# Altium integrated library CustomDevices_OKP.IntLib: 123 symbols (continued)
## Intel_Max10
designator U?, comment 10M16DCF484I6G
footprint 484-Pin FBGA
part A pins: A1 GND, A22 GND, AA4 GND, AA18 GND, AB1 GND, AB22 GND, B6 GND, B9 GND, B13 GND, B18 GND, D4 GND, D11 GND, D16 GND, D20 GND, E2 GND, E7 GND, F10 GND, F13 GND, G5 GND, G6 GND, G8 GND, G15 GND, G18 GND, G21 GND, H5 GND, J2 GND, J6 GND, J16 GND, J19 GND, K10 GND, K12 GND, L5 GND, L13 GND, L17 GND, L21 GND, M7 GND, M10 GND, M16 GND, M19 GND, N11 GND, N13 GND, P2 GND, P6 GND, P17 GND, R19 GND, R21 GND, T4 GND, T8 GND, T14 GND, T16 GND, U10 GND, U13 GND, V2 GND, V6 GND, V19 GND, W21 GND, Y9 GND, Y12 GND, Y15 GND
part B pins: A16 nc, A21 nc, AA17 nc, AA19 nc, AB19 nc, AB20 nc, B16 nc, B20 nc, B21 nc, B22 nc, C15 nc, C16 nc, E5 nc, E17 nc, F6 nc, F17 nc, H18 nc, H19 nc, H20 nc, J5 nc, J14 nc, J15 nc, J18 nc, J20 nc, K3 nc, K18 nc, K19 nc, K20 nc, L3 nc, P8 nc, R7 nc, U3 nc, U4 nc, U5 nc, U19 nc, V3 nc, V15 nc, V18 nc, W1 nc, W2 nc, W16 nc, W22 nc, Y17 nc, Y18 nc, Y22 nc
part C pins: AA4 VREF, AA13 VREF, B15 VREF, C1 VREF, D7 VREF, D21 VREF, F9 VCCIO, F11 VCCIO, F12 VCCIO, F14 VCCIO, G7 VCCP/BCCR/VCCT, G10 VCCIO, G11 VCCIO, G12 VCCIO, G13 VCCIO, G14 VCCIO, G16 VCCP/BCCR/VCCT, H15 VCCA, H16 VCCIO, J7 VCCP/BCCR/VCCT, J17 VCCIO, K7 VCCIO, K11 VCCP/BCCR/VCCT, K13 VCCP/BCCR/VCCT, K16 VCCIO, K17 VCCIO, L6 VCCIO, L7 VCCIO, L10 VCCP/BCCR/VCCT, L11 VCCP/BCCR/VCCT, L12 VCCP/BCCR/VCCT, L16 VCCIO, M2 VREF, M6 VCCIO, M11 VCCP/BCCR/VCCT, M12 VCCP/BCCR/VCCT, M13 VCCP/BCCR/VCCT, M17 VCCIO, N6 VCCIO, N7 VCCIO, N10 VCCP/BCCR/VCCT, N12 VCCP/BCCR/VCCT, N16 VCCIO, N17 VCCIO, P7 VCCIO, P16 VCCIO, P22 VREF, R6 VCCIO, R8 VCCA, R16 VCCIO, R17 VCCIO, T7 VCCP/BCCR/VCCT, T9 VCCIO, T10 VCCIO, T11 VCCIO, T12 VCCIO, T13 VCCIO, T15 VCCA, T17 VCCIO, U8 VCCIO, U9 VCCIO, U11 VCCIO, U12 VCCIO, U14 VCCIO
part D pins: AA1 DATA_IN28, AA2 DATA_IN29, AA5 DATA_IN41, AA6 DATA_IN40, AA7 DATA_IN39, AA8 DATA_IN38, AA9 DATA_IN37, AA10 DATA_IN36, AB2 DATA_IN30, AB3 DATA_IN31, AB4 DATA_IN47, AB5 DATA_IN46, AB6 DATA_IN45, AB7 DATA_IN44, AB8 DATA_IN43, AB9 DATA_IN42, N2 DATA_IN0, P1 DATA_IN4, P3 DATA_IN3, P4 DATA_IN2, P5 DATA_IN1, R1 DATA_IN9, R2 DATA_IN8, R3 DATA_IN7, R4 DATA_IN6, R5 DATA_IN5, T1 DATA_IN12, T2 DATA_IN11, T3 DATA_IN10, U1 DATA_IN14, U2 DATA_IN13, V1 DATA_IN15, V4 DATA_IN16, W3 DATA_IN23, W4 DATA_IN22, W5 DATA_IN21, W6 DATA_IN20, W7 DATA_IN19, W8 DATA_IN18, W9 DATA_IN17, W10 DATA_IN33, Y1 DATA_IN27, Y2 DATA_IN26, Y3 DATA_IN25, Y4 DATA_IN24, Y7 DATA_IN35, Y8 DATA_IN34, Y10 DATA_IN32
part E pins: AA11 DATA_IN60, AA12 DATA_IN59, AA14 DATA_IN57, AA15 DATA_IN55, AA16 DATA_IN75, AA20 DATA_IN69, AA21 DATA_IN67, AA22 DATA_IN65, AB10 DATA_IN63, AB11 DATA_IN62, AB12 DATA_IN61, AB13 DATA_IN58, AB14 DATA_IN56, AB16 DATA_IN78, AB17 DATA_IN77, AB18 DATA_IN76, AB21 DATA_IN68, K6 DATA_IN92, T20 DATA_IN79, T21 DATA_IN80, U18 DATA_IN84, U20 DATA_IN83, U21 DATA_IN82, U22 DATA_IN81, V11 DATA_IN90, V12 DATA_IN89, V13 DATA_IN88, V14 DATA_IN87, V16 DATA_IN86, V17 DATA_IN85, V20 DATA_IN93, V22 DATA_IN91, W11 DATA_IN51, W12 DATA_IN50, W13 DATA_IN49, W14 DATA_IN48, W15 DATA_IN73, W17 DATA_IN72, W18 DATA_IN71, W19 DATA_IN95, W20 DATA_IN94, Y11 DATA_IN54, Y13 DATA_IN53, Y14 DATA_IN52, Y16 DATA_IN74, Y19 DATA_IN70, Y20 DATA_IN66, Y21 DATA_IN64
part F pins: A2 DATA_IN138, A3 DATA_IN137, A4 DATA_IN136, A5 DATA_IN135, A6 DATA_IN134, A7 DATA_IN133, A8 DATA_IN130, A9 DATA_IN128, B1 DATA_IN143, B2 DATA_IN142, B3 DATA_IN141, B4 DATA_IN140, B5 DATA_IN139, B7 DATA_IN132, B8 DATA_IN129, C3 DATA_IN115, C4 DATA_IN114, C5 DATA_IN113, C7 DATA_IN131, D1 DATA_IN127, D2 DATA_IN126, D5 DATA_IN116, D6 DATA_IN112, E1 DATA_IN97, E3 DATA_IN96, E4 DATA_IN118, E6 DATA_IN117, F1 DATA_IN98, F3 DATA_IN121, F4 DATA_IN120, F5 DATA_IN119, G1 DATA_IN101, G3 DATA_IN123, G4 DATA_IN122, H1 DATA_IN102, H3 DATA_IN125, H4 DATA_IN124, J1 DATA_IN106, J3 DATA_IN105, J4 DATA_IN103, J8 DATA_IN99, K1 DATA_IN108, K2 DATA_IN107, K4 DATA_IN104, K5 DATA_IN100, L1 DATA_IN110, L2 DATA_IN109, M1 DATA_IN111
part G pins: A10 DATA_IN154, A11 DATA_IN155, A12 DATA_IN156, A13 DATA_IN157, A14 DATA_IN158, A15 DATA_IN159, A17 DATA_IN172, A18 DATA_IN173, A19 DATA_IN174, A20 DATA_IN175, B10 DATA_IN150, B11 DATA_IN151, B12 DATA_IN152, B14 DATA_IN153, B17 DATA_IN170, B19 DATA_IN171, C9 DATA_IN144, C10 DATA_IN145, C11 DATA_IN146, C12 DATA_IN147, C13 DATA_IN148, C14 DATA_IN149, C17 DATA_IN168, C18 DATA_IN169, D12 DATA_IN164, D13 DATA_IN165, D14 DATA_IN166, D15 DATA_IN167, E12 DATA_IN160, E13 DATA_IN161, E14 DATA_IN162, E15 DATA_IN163, E21 DATA_IN178, E22 DATA_IN184, F21 DATA_IN179, F22 DATA_IN185, G19 DATA_IN177, G20 DATA_IN176, G22 DATA_IN186, H21 DATA_IN180, H22 DATA_IN187, J21 DATA_IN181, J22 DATA_IN188, L22 DATA_IN189, M21 DATA_IN182, M22 DATA_IN190, N21 DATA_IN183, N22 DATA_IN191
part H pins: K16 SYNC2, L14 IO15, L15 IO14, L16 SYNC1, L18 IO07, L19 IO06, L20 IO05, M14 IO13, M15 IO12, M18 IO04, M20 IO03, N18 IO02, N19 IO01, N20 IO00, P14 IO11, P15 IO10, R14 IO09, R15 IO08
part I pins: G2 TCK, H2 TMS, H12 DATA_IN195, H13 DATA_IN196, J11 DATA_IN192, J12 DATA_IN193, J13 DATA_IN194, L4 TDI, M5 TDO

## IRLML6346TRPbF
designator VT?
footprint SOT23-3 (SOT23, 3 pin)
pins: 1 Gate, 2 Source, 3 Drain

## IRML6401
designator *
footprint SOT23-3 (SOT23, 3 pin)
pins: 1 GATE, 2 SOURCE, 3 DRAIN

## IS25WP128-JBLE
designator *
footprint SO-8
pins: 1 CE, 2 SO_IO1, 3 WP_IO2, 4 GND, 5 SI_IO0, 6 SCK, 7 HOLD/RESET_IO3, 8 VCC

## KLS7-TS6604
designator SB?
footprint KLS7-TS6604 (Button)
pins: 1, 2, 3, 4

## KPT-1608xxx
designator *
footprint KPT-2608SGC
pins: 1, 2

## KT11P2JM34LFS
designator *
footprint KT11P2JM34LFS
pins: 1, 2, 3, 4

## LM2611A
designator *
footprint SOT23-5
pins: 1 SW, 2 GND, 3 NFB, 4 SHDN, 5 VIN

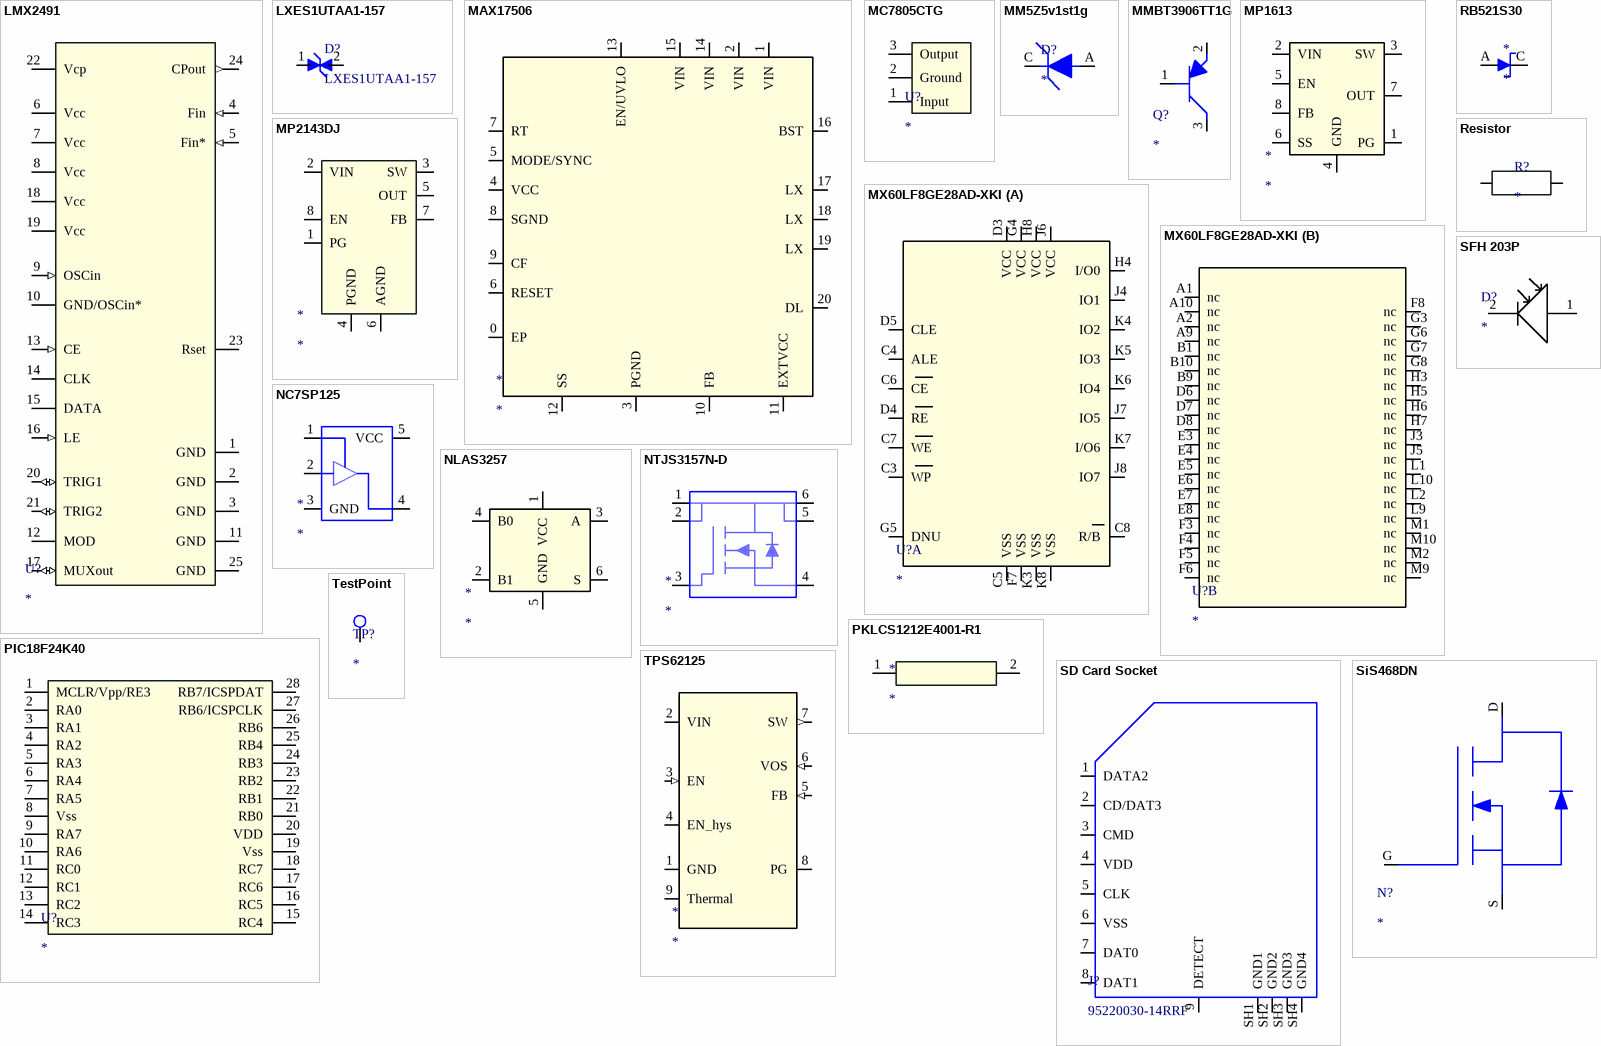
[diagram p5: symbols LMX2491 to TPS62125]

## LMX2491
designator U?
footprint WQFN24
pins: 1 GND, 2 GND, 3 GND, 4 Fin (in), 5 Fin* (in), 6 Vcc, 7 Vcc, 8 Vcc, 9 OSCin (in), 10 GND/OSCin*, 11 GND, 12 MOD, 13 CE (in), 14 CLK, 15 DATA, 16 LE (in), 17 MUXout (io), 18 Vcc, 19 Vcc, 20 TRIG1 (io), 21 TRIG2 (io), 22 Vcp, 23 Rset, 24 CPout (out), 25 GND

## LXES1UTAA1-157
designator D?
footprint DFN
pins: 1, 2

## MAX17506
designator *
footprint QFN-20
pins: 0 EP, 1 VIN, 2 VIN, 3 PGND, 4 VCC, 5 MODE/SYNC, 6 RESET, 7 RT, 8 SGND, 9 CF, 10 FB, 11 EXTVCC, 12 SS, 13 EN/UVLO, 14 VIN, 15 VIN, 16 BST, 17 LX, 18 LX, 19 LX, 20 DL

## MC7805CTG
designator U?
footprint TO220
pins: 1 Input, 2 Ground, 3 Output

## MM5Z5v1st1g
designator D?
footprint SOD-523
pins: A 2, C 1

## MMBT3906TT1G
designator Q?
footprint SOT-416
pins: 1, 2 3, 3 2

## MP1613
designator *
footprint SOT583
pins: 1 PG, 2 VIN, 3 SW, 4 GND, 5 EN, 6 SS, 7 OUT, 8 FB

## MP2143DJ
designator *
footprint TSOT23-8
pins: 1 PG, 2 VIN, 3 SW, 4 PGND, 5 OUT, 6 AGND, 7 FB, 8 EN

## MX60LF8GE28AD-XKI
designator U?
footprint VFBGA63
part A pins: C3 WP, C4 ALE, C5 VSS, C6 CE, C7 WE, C8 R/B, D3 VCC, D4 RE, D5 CLE, F7 VSS, G4 VCC, G5 DNU, H4 I/O0, H8 VCC, J4 IO1, J6 VCC, J7 IO5, J8 IO7, K3 VSS, K4 IO2, K5 IO3, K6 IO4, K7 I/O6, K8 VSS
part B pins: A1 nc, A2 nc, A9 nc, A10 nc, B1 nc, B9 nc, B10 nc, D6 nc, D7 nc, D8 nc, E3 nc, E4 nc, E5 nc, E6 nc, E7 nc, E8 nc, F3 nc, F4 nc, F5 nc, F6 nc, F8 nc, G3 nc, G6 nc, G7 nc, G8 nc, H3 nc, H5 nc, H6 nc, H7 nc, J3 nc, J5 nc, L1 nc, L2 nc, L9 nc, L10 nc, M1 nc, M2 nc, M9 nc, M10 nc

## NC7SP125
designator *
footprint SC-88A
pins: 1, 2, 3 GND, 4, 5 VCC

## NLAS3257
designator *
footprint ULLGA6
pins: 1 VCC, 2 B1, 3 A, 4 B0, 5 GND, 6 S

## NTJS3157N-D
designator *
footprint SOT-363
pins: 1, 2, 3, 4, 5, 6

## PIC18F24K40
designator U?
Microchip, 28-Pin, Low-Power, High-Performance Microcontrollers  with XLP Technology
footprint SSOP28_N (SOP, 28-Leads, Body 10.2x5.3mm, Pitch 0.65mm, IPC Medium Density)
pins: 1 MCLR/Vpp/RE3, 2 RA0, 3 RA1, 4 RA2, 5 RA3, 6 RA4, 7 RA5, 8 Vss, 9 RA7, 10 RA6, 11 RC0, 12 RC1, 13 RC2, 14 RC3, 15 RC4, 16 RC5, 17 RC6, 18 RC7, 19 Vss, 20 VDD, 21 RB0, 22 RB1, 23 RB2, 24 RB3, 25 RB4, 26 RB6, 27 RB6/ICSPCLK, 28 RB7/ICSPDAT

## PKLCS1212E4001-R1
designator *
footprint PKLCS1212E4001-R1
pins: 1 IN, 2 OUT

## RB521S30
designator *
footprint SOD-523
pins: A, C

## Resistor
designator R?
footprint Res0603
footprint ResMCU0805WS
footprint res0402
footprint res1210
footprint res2010
pins: 1 a, 2 a

## SD Card Socket
designator J?, comment 95220030-14RRF
footprint Mini SD_CARD
pins: 1 DATA2, 2 CD/DAT3, 3 CMD, 4 VDD, 5 CLK, 6 VSS, 7 DAT0, 8 DAT1, 9 DETECT, SH1 GND1, SH2 GND2, SH3 GND3, SH4 GND4

## SFH 203P
designator D?
footprint SFH 203P
pins: 1 Anode, 2 Cathode

## SiS468DN
designator N?
footprint PowerPAK 1212-8(Single)
pins: D DRAIN, G GATE, S SOURCE

## TestPoint
designator TP?
footprint TestPoint
pins: 1

## TPS62125
designator *
VIN: 3V to 17V VOUT: 1.2V to 10V
footprint WSON 2x2mm
pins: 1 GND, 2 VIN, 3 EN (in), 4 EN_hys, 5 FB (in), 6 VOS (in), 7 SW (out), 8 PG, 9 Thermal 

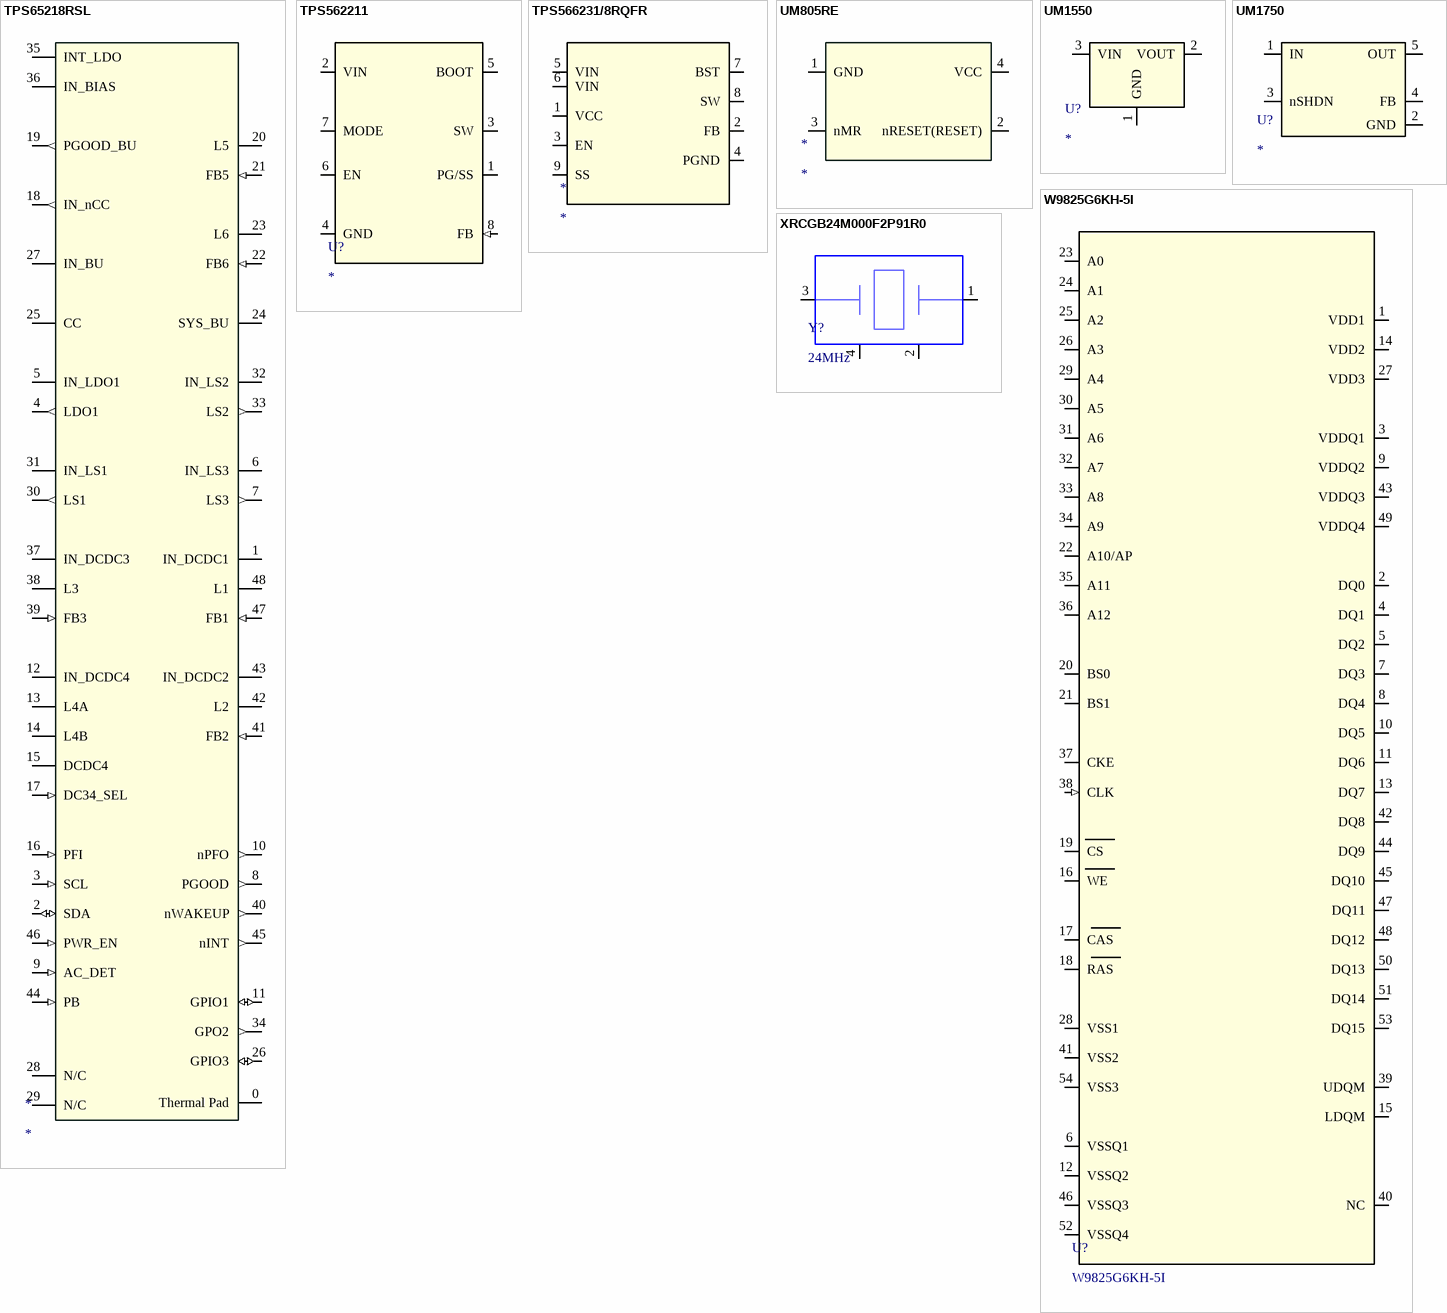
[diagram p6: symbols TPS65218RSL to XRCGB24M000F2P91R0]

## TPS65218RSL
designator *
footprint S-PQFN-N48
pins: 0 Thermal Pad, 1 IN_DCDC1, 2 SDA (io), 3 SCL (in), 4 LDO1 (out), 5 IN_LDO1, 6 IN_LS3, 7 LS3 (out), 8 PGOOD (out), 9 AC_DET (in), 10 nPFO (out), 11 GPIO1 (io), 12 IN_DCDC4, 13 L4A, 14 L4B, 15 DCDC4, 16 PFI (in), 17 DC34_SEL (in), 18 IN_nCC (out), 19 PGOOD_BU (out), 20 L5, 21 FB5 (in), 22 FB6 (in), 23 L6, 24 SYS_BU, 25 CC, 26 GPIO3 (io), 27 IN_BU, 28 N/C, 29 N/C, 30 LS1 (out), 31 IN_LS1, 32 IN_LS2, 33 LS2 (out), 34 GPO2 (out), 35 INT_LDO, 36 IN_BIAS, 37 IN_DCDC3, 38 L3, 39 FB3 (in), 40 nWAKEUP (out), 41 FB2 (in), 42 L2, 43 IN_DCDC2, 44 PB (in), 45 nINT (out), 46 PWR_EN (in), 47 FB1 (in), 48 L1

## TPS562211
designator U?
4.2V to 18V Input. 0.6V to 7V Output
footprint SOT583
pins: 1 PG/SS (io), 2 VIN, 3 SW, 4 GND, 5 BOOT, 6 EN (io), 7 MODE (io), 8 FB (in)

## TPS566231/8RQFR
designator *
footprint VQFN-HR
pins: 1 VCC, 2 FB, 3 EN, 4 PGND, 5 VIN, 6 VIN, 7 BST, 8 SW, 9 SS

## UM805RE
designator *
footprint SOT143 (SOT143, 4-Leads, Body 2,92x2,37mm, Pitch 1,90mm, IPC High Density)
pins: 1 GND, 2 nRESET(RESET), 3 nMR, 4 VCC

## UM1550
designator U?
footprint SOT23-3 (SOT23, 3 pin)
pins: 1 GND, 2 VOUT, 3 VIN

## UM1750
designator U?
footprint SOT23-5
pins: 1 IN, 2 GND, 3 nSHDN, 4 FB, 5 OUT

## W9825G6KH-5I
designator U?
SD RAM на 256Мбит = 4М*4Банка*16Битов
footprint TSOP2-54L
pins: 1 VDD1 (power), 2 DQ0 (io), 3 VDDQ1, 4 DQ1 (io), 5 DQ2 (io), 6 VSSQ1, 7 DQ3 (io), 8 DQ4 (io), 9 VDDQ2, 10 DQ5 (io), 11 DQ6 (io), 12 VSSQ2, 13 DQ7 (io), 14 VDD2 (power), 15 LDQM, 16 WE, 17 CAS, 18 RAS, 19 CS, 20 BS0, 21 BS1, 22 A10/AP, 23 A0, 24 A1, 25 A2, 26 A3, 27 VDD3 (power), 28 VSS1, 29 A4, 30 A5, 31 A6, 32 A7, 33 A8, 34 A9, 35 A11, 36 A12, 37 CKE, 38 CLK (in), 39 UDQM, 40 NC, 41 VSS2, 42 DQ8 (io), 43 VDDQ3, 44 DQ9 (io), 45 DQ10 (io), 46 VSSQ3, 47 DQ11 (io), 48 DQ12 (io), 49 VDDQ4, 50 DQ13 (io), 51 DQ14 (io), 52 VSSQ4, 53 DQ15 (io), 54 VSS3

## XRCGB24M000F2P91R0
designator Y?, comment 24MHz
footprint XRCGB24M000F2P91R0
pins: 1, 2, 3, 4


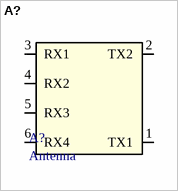
[diagram p7: symbol A?]

## A?
designator A?, comment Antenna
footprint Antenna (24GHz)
pins: 1 TX1, 2 TX2, 3 RX1, 4 RX2, 5 RX3, 6 RX4


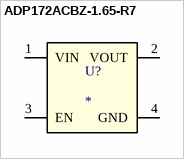
[diagram p8: symbol ADP172ACBZ-1.65-R7]

## ADP172ACBZ-1.65-R7
designator U?
footprint 4-Ball WLCSP; pin to pad 1>A1 2>A2 3>B1 4>B2
pins: 1 VIN, 2 VOUT, 3 EN, 4 GND


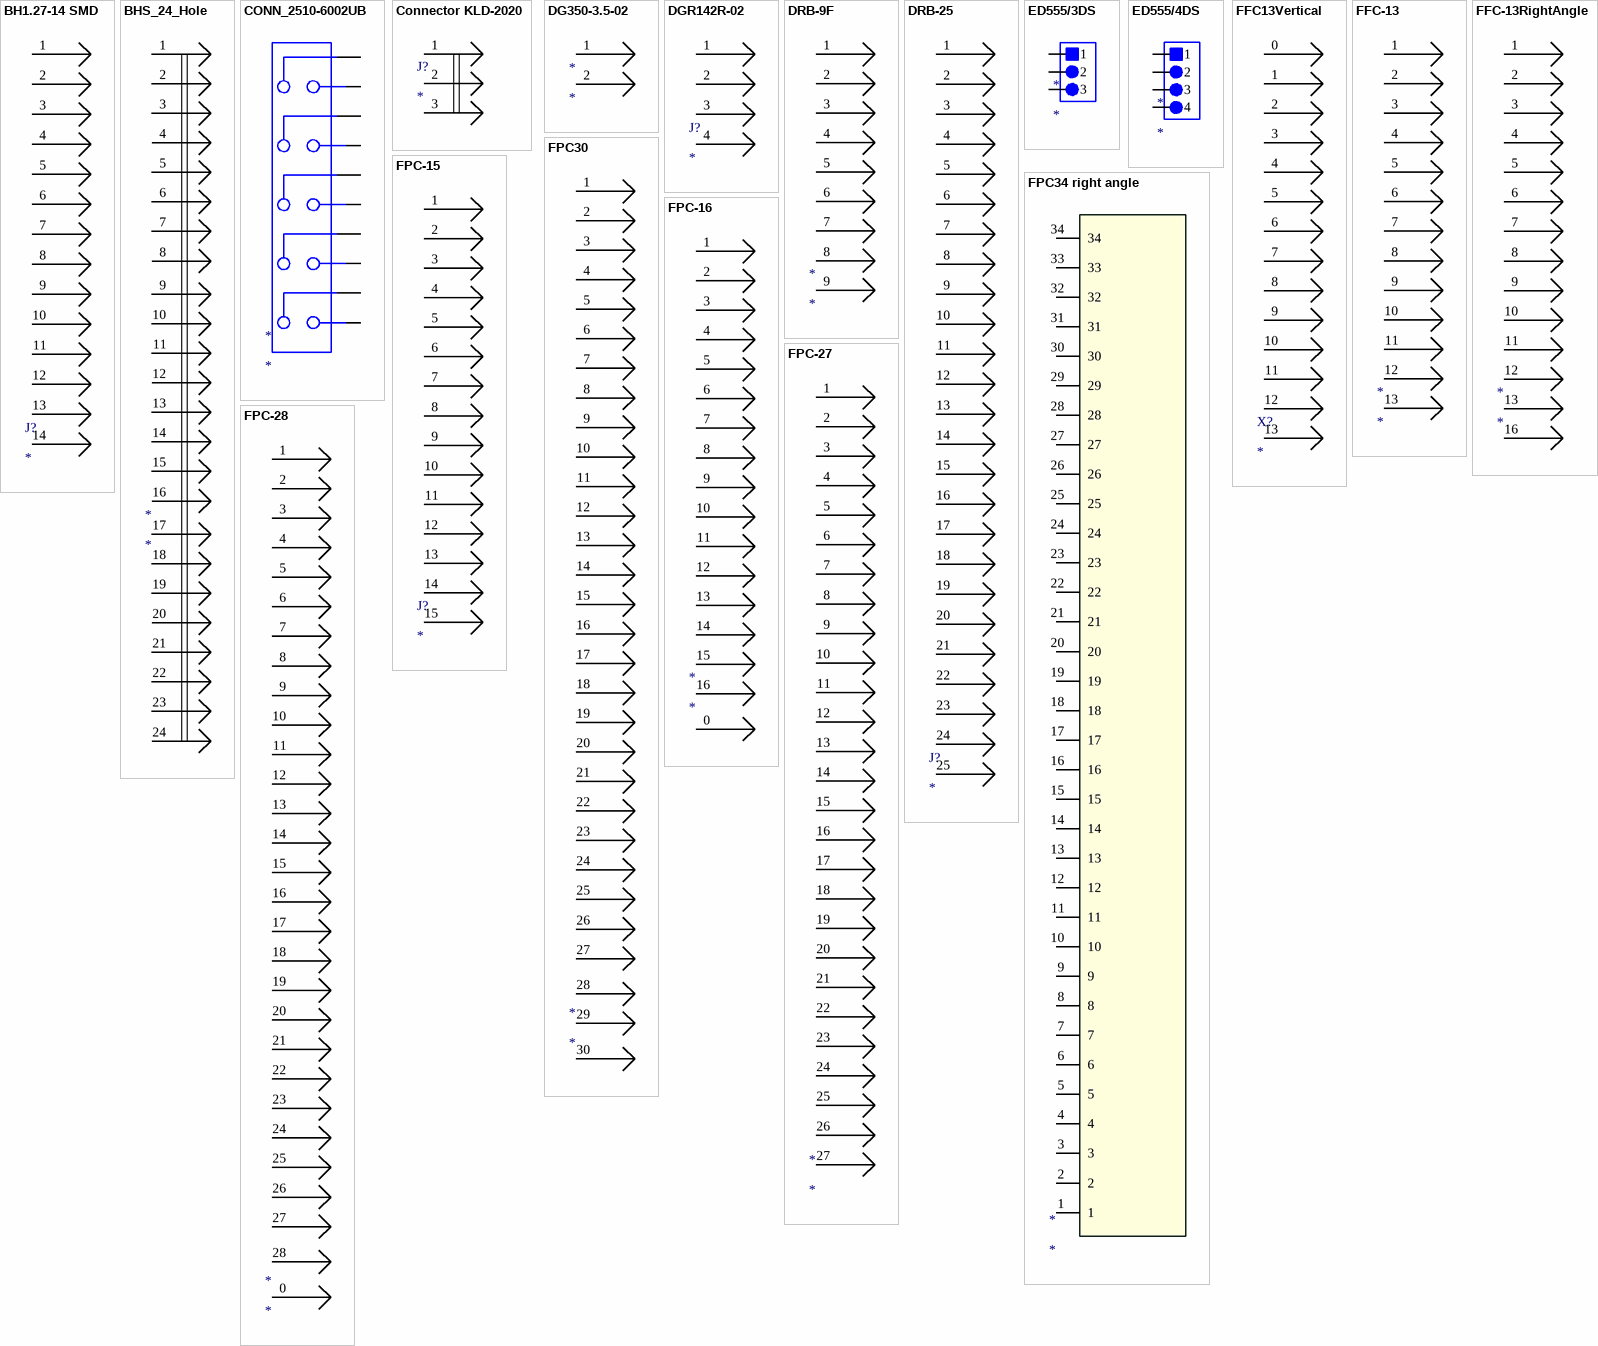
[diagram p9: symbols BH1.27-14 SMD to FPC-28]

## BH1.27-14 SMD
designator J?
footprint BH1.27-14 SMD
pins: 1, 2, 3, 4, 5, 6, 7, 8, 9, 10, 11, 12, 13, 14

## BHS_24_Hole
designator *
footprint BHS-24_HOLE
pins: 1, 2, 3, 4, 5, 6, 7, 8, 9 1, 10 2, 11 3, 12 4, 13 5, 14 6, 15 7, 16 1, 17 1, 18 2, 19 3, 20 4, 21 5, 22 6, 23 7, 24 8

## CONN_2510-6002UB
designator *
footprint CONN_2510-6002UB
pins: 1, 2, 3, 4, 5, 6, 7, 8, 9, 10

## Connector KLD-2020
designator J?
KLD-2020
footprint KLD-2020
pins: 1, 2, 3

## DG350-3.5-02
designator *
footprint DG350-3.5-02
pins: 1, 2

## DGR142R-02
designator J?
footprint DG142R-02
pins: 1, 2, 3, 4

## DRB-9F
designator *
footprint DRB- 9F
pins: 1, 2, 3, 4, 5, 6, 7, 8, 9

## DRB-25
designator J?
footprint DRB-25
pins: 1, 2, 3, 4, 5, 6, 7, 8, 9, 10, 11, 12, 13, 14, 15, 16, 17, 18, 19, 20, 21, 22, 23, 24, 25

## ED555/3DS
designator *
pins: 1, 2, 3

## ED555/4DS
designator *
pins: 1, 2, 3, 4

## FFC13Vertical
designator X?
footprint FFC13 Vertical
pins: 0, 1, 2, 3, 4, 5, 6, 7, 8, 9, 10, 11, 12, 13

## FFC-13
designator *
footprint FFC-13 (1.00mm Pitch Easy-On FFC/FPC Connector, Surface Mount, Vertical, Non-ZIF, Tin (Sn) Plating, 13 Circuits)
pins: 1, 2, 3, 4, 5, 6, 7, 8, 9, 10, 11, 12, 13

## FFC-13RightAngle
designator *
footprint FPC-13RightAngle
pins: 1, 2, 3, 4, 5, 6, 7, 8, 9, 10, 11, 12, 13, 16 GND

## FPC30
designator *
footprint FFC/FPC 30
pins: 1, 2, 3, 4, 5, 6, 7, 8, 9, 10, 11, 12, 13, 14, 15, 16, 17, 18, 19, 20, 21, 22, 23, 24, 25, 26, 27, 28, 29, 30

## FPC34 right angle
designator *
footprint fpcmolex34
pins: 1, 2, 3, 4, 5, 6, 7, 8, 9, 10, 11, 12, 13, 14, 15, 16, 17, 18, 19, 20, 21, 22, 23, 24, 25, 26, 27, 28, 29, 30, 31, 32, 33, 34

## FPC-15
designator J?
footprint FPC-15
pins: 1, 2, 3, 4, 5, 6, 7, 8, 9, 10, 11, 12, 13, 14, 15

## FPC-16
designator *
footprint FPC-16
pins: 0 GND, 1, 2, 3, 4, 5, 6, 7, 8, 9, 10, 11, 12, 13, 14, 15, 16

## FPC-27
designator *
pins: 1, 2, 3, 4, 5, 6, 7, 8, 9, 10, 11, 12, 13, 14, 15, 16, 17, 18, 19, 20, 21, 22, 23, 24, 25, 26, 27

## FPC-28
designator *
footprint FPC-28
pins: 0 GND, 1, 2, 3, 4, 5, 6, 7, 8, 9, 10, 11, 12, 13, 14, 15, 16, 17, 18, 19, 20, 21, 22, 23, 24, 25, 26, 27, 28

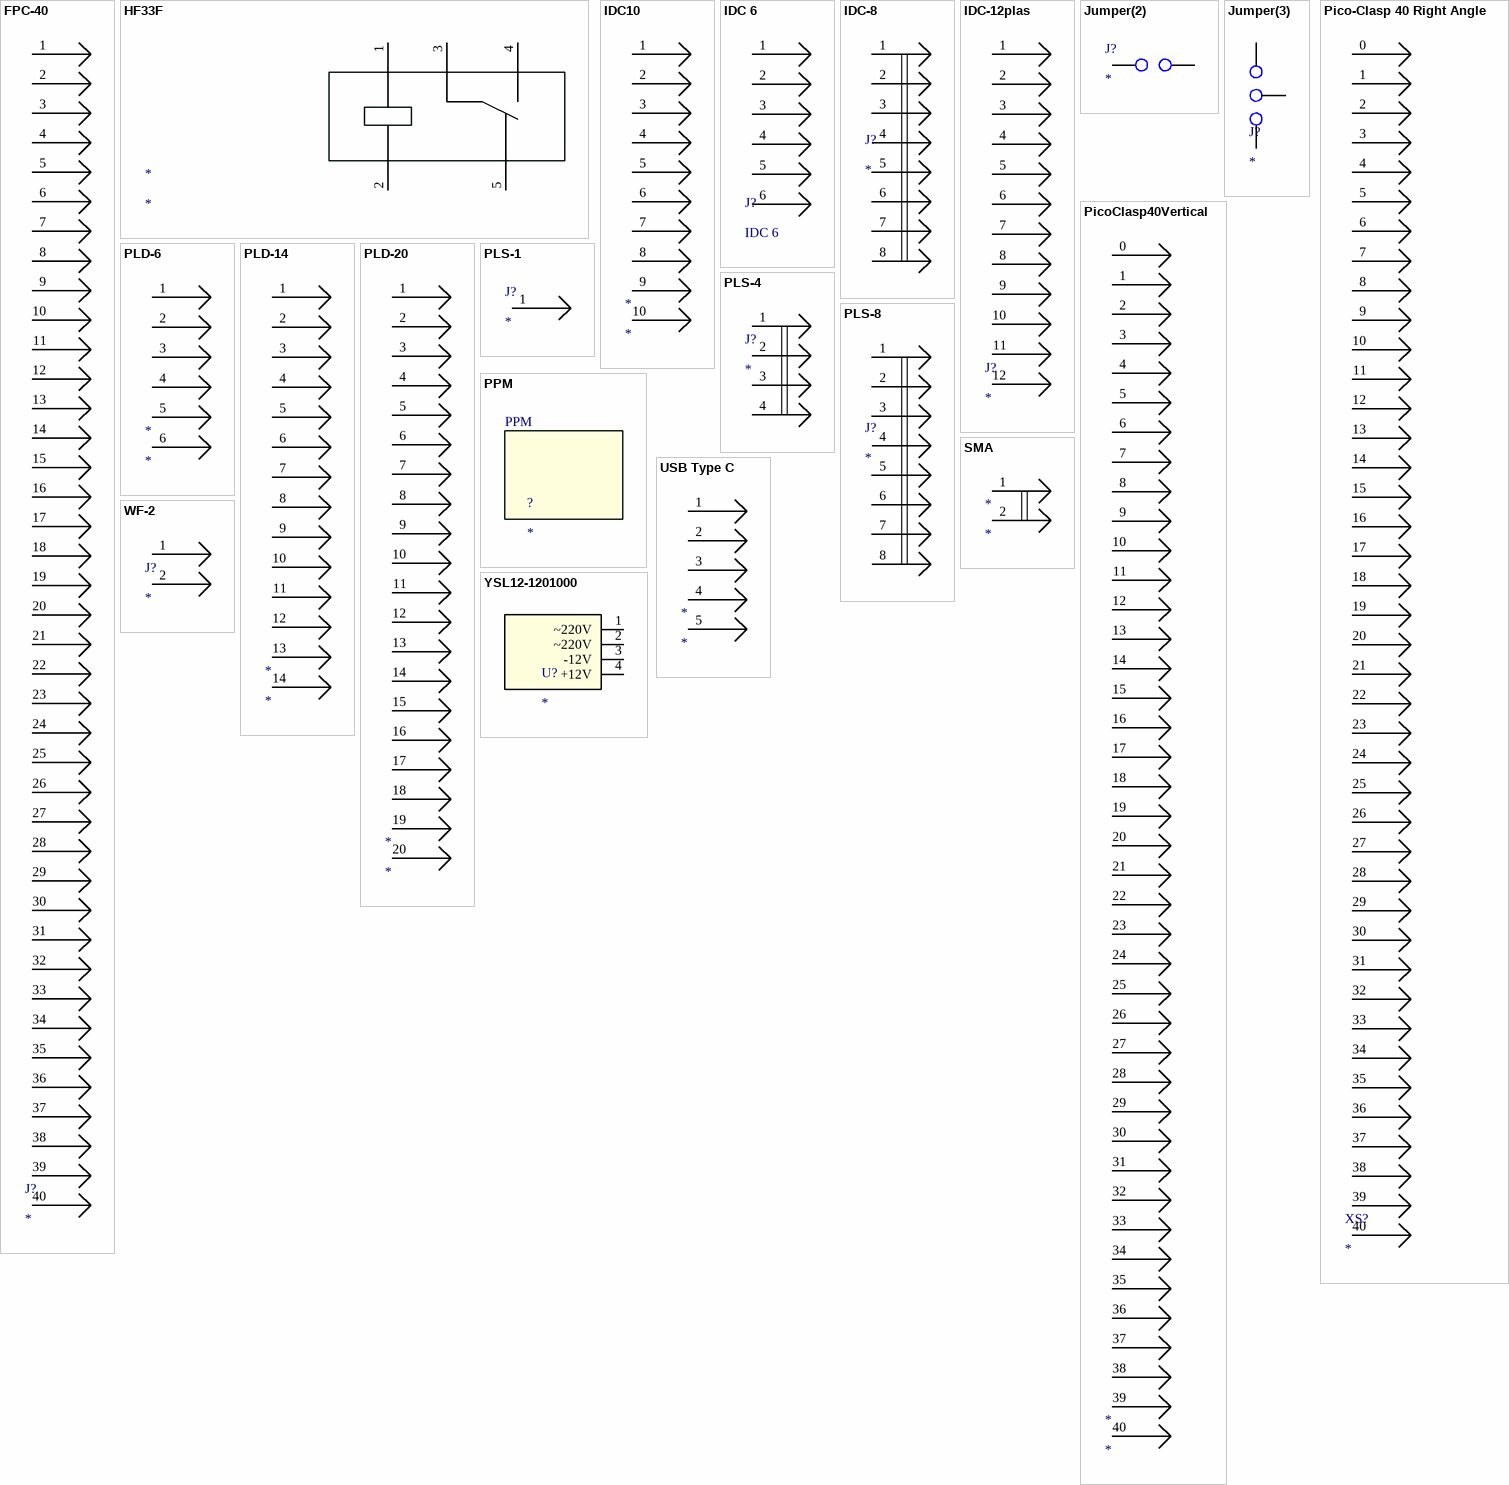
[diagram p10: symbols FPC-40 to YSL12-1201000]

## FPC-40
designator J?
footprint FPC-40
pins: 1, 2, 3, 4, 5, 6, 7, 8, 9, 10, 11, 12, 13, 14, 15, 16, 17, 18, 19, 20, 21, 22, 23, 24, 25, 26, 27, 28, 29, 30, 31, 32, 33, 34, 35, 36, 37, 38, 39, 40

## HF33F
designator *
footprint HF33F
pins: 1 ReLe, 2 REle, 3 GND, 4 GND, 5 GND

## IDC10
designator *
footprint IDC10
pins: 1, 2, 3, 4, 5, 6, 7, 8, 9, 10

## IDC 6
designator J?
footprint IDC-6
pins: 1, 2, 3, 4, 5, 6

## IDC-8
designator J?
footprint IDC-8
pins: 1, 2, 3, 4, 5, 6, 7, 8

## IDC-12plas
designator J?
footprint IDC_12plas
pins: 1, 2, 3, 4, 5, 6, 7, 8, 9, 10, 11, 12

## Jumper(2)
designator J?
footprint PEC02SAAN
pins: 1, 2

## Jumper(3)
designator J?
footprint PEC03SAAN
pins: 1, 2, 3

## Pico-Clasp 40 Right Angle
designator XS?
footprint Pico-Clasp 40 (2035674007 Molex)
pins: 0 GND, 1, 2, 3, 4, 5, 6, 7, 8, 9, 10, 11, 12, 13, 14, 15, 16, 17, 18, 19, 20, 21, 22, 23, 24, 25, 26, 27, 28, 29, 30, 31, 32, 33, 34, 35, 36, 37, 38, 39, 40

## PicoClasp40Vertical
designator *
footprint PICO-Clasp 40 Vertical
pins: 0 GND, 1, 2, 3, 4, 5, 6, 7, 8, 9, 10, 11, 12, 13, 14, 15, 16, 17, 18, 19, 20, 21, 22, 23, 24, 25, 26, 27, 28, 29, 30, 31, 32, 33, 34, 35, 36, 37, 38, 39, 40

## PLD-6
designator *
footprint PLD-6
pins: 1, 2, 3, 4, 5, 6

## PLD-14
designator *
footprint PLD-14
pins: 1, 2, 3, 4, 5, 6, 7, 8, 9, 10, 11, 12, 13, 14

## PLD-20
designator *
footprint PLD-20
pins: 1, 2, 3, 4, 5, 6, 7, 8, 9, 10, 11, 12, 13, 14, 15, 16, 17, 18, 19, 20

## PLS-1
designator J?
footprint PLS-1
pins: 1

## PLS-4
designator J?
footprint PLS-4
pins: 1, 2, 3, 4

## PLS-8
designator J?
footprint PLS-8
pins: 1, 2, 3, 4, 5, 6, 7, 8

## PPM
designator ?
footprint StorkTale

## SMA
designator *
footprint 5-1814400-1 (TE, SMA Connector Jack, Female Socket 50 Ohm Through Hole, Right Angle Solder)
pins: 1, 2

## USB Type C
designator *
footprint 47491-0001
pins: 1, 2, 3, 4, 5

## WF-2
designator J?
footprint WF-2
pins: 1, 2

## YSL12-1201000
designator U?
Led Power Supply. In 180-240V, Out 12V
footprint YSL12-1201000
pins: 1 ~220V, 2 ~220V, 3 -12V, 4 +12V


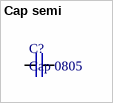
[diagram p11: symbol Cap semi]

## Cap semi
designator C?, comment Cap 0805
footprint Cap 0805
pins: 1, 2


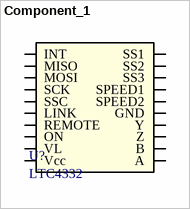
[diagram p12: symbol Component_1]

## Component_1
designator U?, comment LTC4332
footprint LTC4332
pins: 1 Vcc, 2 VL, 3 ON, 4 REMOTE, 5 LINK, 6 SSC, 7 SCK, 8 MOSI, 9 MISO, 10 INT, 11 SS1, 12 SS2, 13 SS3, 14 SPEED1, 15 SPEED2, 16 GND, 17 Y, 18 Z, 19 B, 20 A


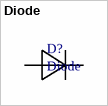
[diagram p13: symbol Diode]

## Diode
designator D?
footprint Diode[SOD-523]
pins: A, C


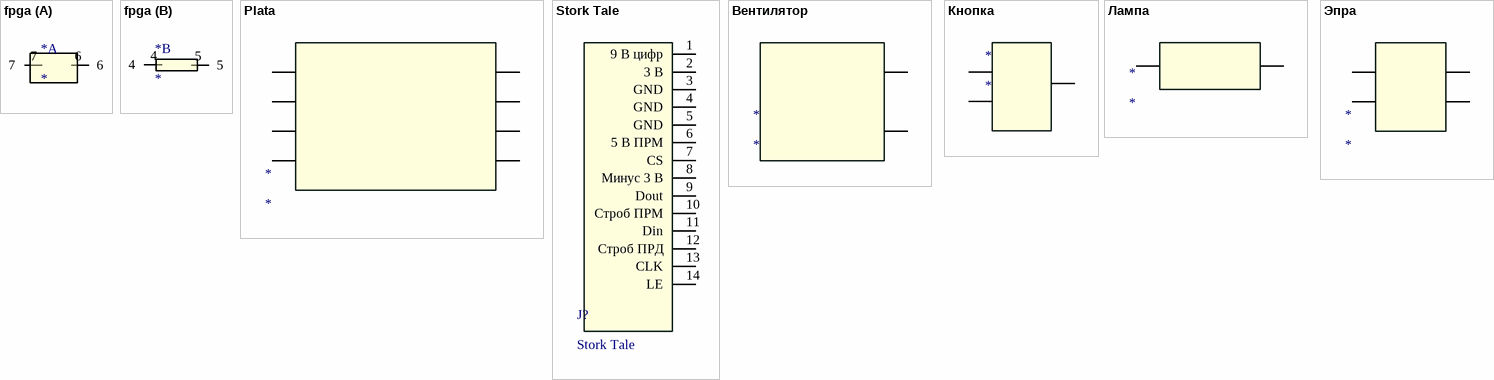
[diagram p14: symbols fpga to Эпра]

## fpga
designator *
footprint FPC-15
part A pins: 6, 7
part B pins: 4, 5

## Plata
designator *
pins: 1 WF-2, 1 WF-2, 1 WF-2, 1 WF-2, 1 WF-2, 1 WF-2, 1 WF-2, 1 WF-2

## Stork Tale
designator J?
footprint Stork Tale
pins: 1 9 B цифр, 2 3 B, 3 GND, 4 GND, 5 GND, 6 5 B ПРМ, 7 CS, 8 Минус 3 В, 9 Dout, 10 Строб ПРМ, 11 Din, 12 Строб ПРД, 13 CLK, 14 LE

## Вентилятор
designator *
pins: 5 DGR 142R-04, 5 DGR 142R-04

## Кнопка
designator *
pins: 3 DGR 142R-02, 3 DGR 142R-02, 3 DGR 142R-02

## Лампа
designator *
pins: 7 DGR 142R-06, 8 DGR 142R-07

## Эпра
designator *
pins: 3 DGR 142R-02, 3 DGR 142R-02, 3 DGR 142R-02, 3 DGR 142R-02


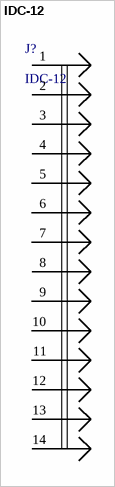
[diagram p15: symbol IDC-12]

## IDC-12
designator J?
footprint IDC-12
pins: 1, 2, 3, 4, 5, 6, 7, 8, 9, 10, 11, 12, 13, 14


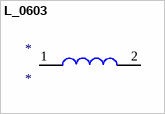
[diagram p16: symbol L_0603]

## L_0603
designator *
footprint L
pins: 1, 2


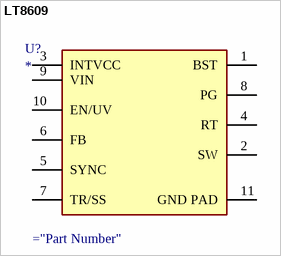
[diagram p17: symbol LT8609]

## LT8609
designator U?
footprint 10-Lead Plastic MSOP
pins: 1 BST, 2 SW, 3 INTVCC, 4 RT, 5 SYNC, 6 FB, 7 TR/SS, 8 PG, 9 VIN, 10 EN/UV, 11 GND PAD


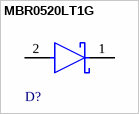
[diagram p18: symbol MBR0520LT1G]

## MBR0520LT1G
designator D?  (value not drawn)
footprint Sod123
pins: 1 C, 2 A


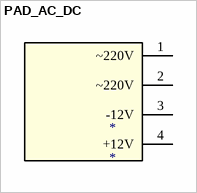
[diagram p19: symbol PAD_AC_DC]

## PAD_AC_DC
designator *
footprint AC_DC PAD
pins: 1 ~220V, 2 ~220V, 3 -12V, 4 +12V


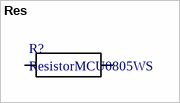
[diagram p20: symbol Res]

## Res
designator R?, comment ResistorMCU0805WS
footprint ResMCU0805WS
pins: 1, 2


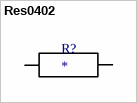
[diagram p21: symbol Res0402]

## Res0402
designator R?
footprint Res0402
footprint Res 1206
footprint RES 0805
pins: 1, 2


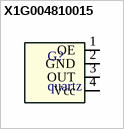
[diagram p22: symbol X1G004810015]

## X1G004810015
designator G?, comment quartz
Crystal Oscillator 1MHz - 170 MHz
footprint SG7050 (Crystal oscillator)
pins: 1 OE, 2 GND, 3 OUT, 4 Vcc